# Altium footprint library Cyberdeck.PcbLib: 261 footprints (part 10 of 17)
Each footprint in its own frame and in the unit in brackets; x right, y up, seen from the top. Pads: shape width x height; smd on the part's side, far side on the other; paste and mask are expansions set on the pad; w line width, h text height; cw(c..) or ccw(c..) is an arc to the next point about the centre after c.
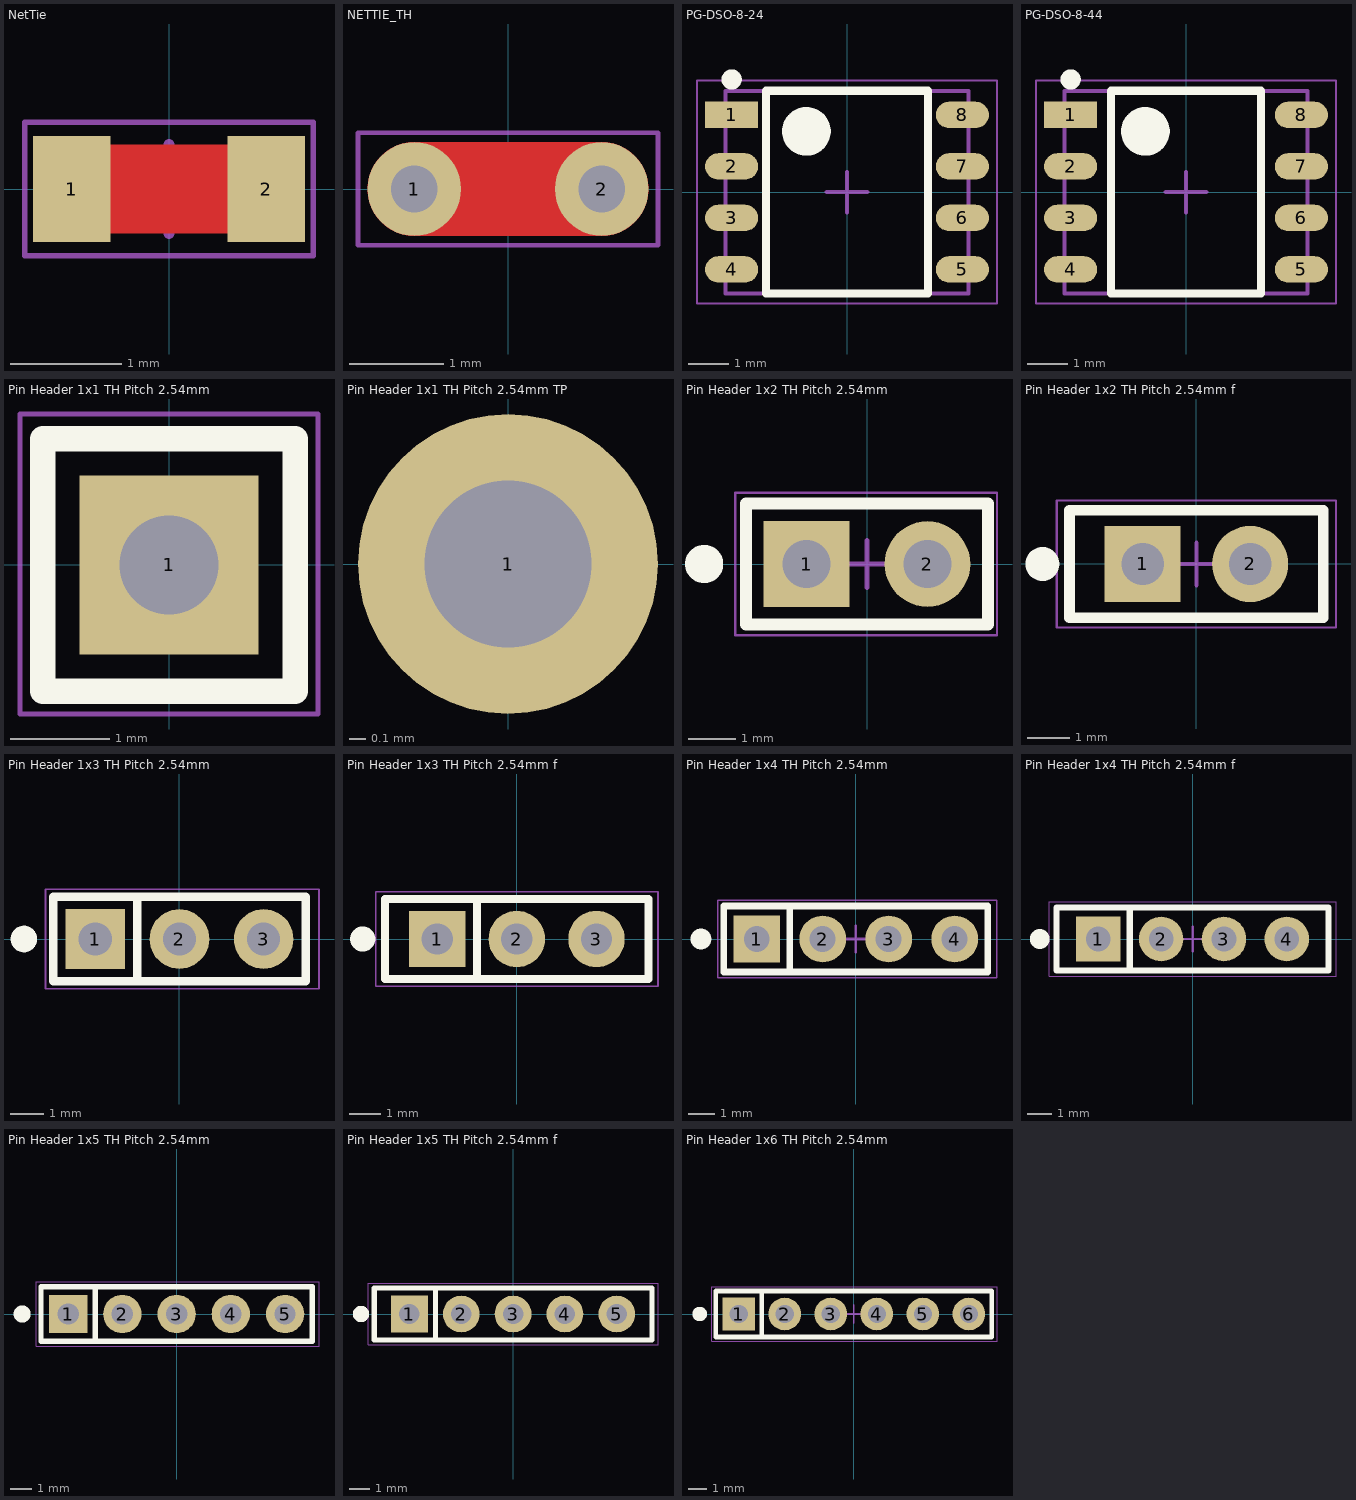
[diagram p9: the footprints below, top view; thin cyan lines are the x and y axes]

## NetTie [mm] "0603 fooprint"
pads (2):
  rect 0.7x0.95 smd paste-5 mask-5: 1(-0.875,0) 2(0.875,0)
Top Layer:
  rectangle: -1,-0.4 0.9,0.4
Courtyard Top:
  lines w0.05: -1.3,-0.6 1.3,-0.6 1.3,0.6 -1.3,0.6 -1.3,-0.6
  lines w0.1: -0.4,0 0.4,0 ; 0,-0.4 0,0.4

## NETTIE_TH [mm]
pads (2):
  round 1 hole 0.5: 1(-1,0) 2(1,0)
Top Layer:
  lines w1: -1,0 1,0
Courtyard Top:
  lines w0.05: -1.6,-0.6 -1.6,0.6 1.6,0.6 1.6,-0.6 -1.6,-0.6
  lines w0.1: -0.4,0 0.4,0 ; 0,-0.4 0,0.4

## PCB LEGEND [mm] "Layerlegend"
Top Layer:
  text "TOP / '.Pr_Firma' / '.Pr_PCB_Nr' Rev '.Pr_PCB_Revision' / '.Pr_Bezeichnung'" at 0,0 h1.52
Mid-Layer 1:
  text "MID 1 / '.Pr_Firma' / '.Pr_PCB_Nr' Rev '.Pr_PCB_Revision' / '.Pr_Bezeichnung'" at 0,0 h1.52
Mid-Layer 2:
  text "MID 2 / '.Pr_Firma' / '.Pr_PCB_Nr' Rev '.Pr_PCB_Revision' / '.Pr_Bezeichnung'" at 0,0 h1.52
Bottom Layer:
  text "BOT / '.Pr_Firma' / '.Pr_PCB_Nr' Rev '.Pr_PCB_Revision' / '.Pr_Bezeichnung'" at 28.5,0 h1.52
Mechanical 14:
  text "'.Pr_Firma' / '.Pr_Artikel_Nr'  / '.VariantName' / '.Pr_Bezeichnung'" at 0,0 h1.52

## PG-DSO-8-24 [mm] "PG-DSO-8-24"
height 1.75
pads (8):
  rect 1.31x0.65 smd: 1(-2.845,1.905)
  oval 1.31x0.65 smd: 2(-2.845,0.635) 3(-2.845,-0.635) 4(-2.845,-1.905) 5(2.845,-1.905) 6(2.845,-0.635) 7(2.845,0.635) 8(2.845,1.905)
Top Overlay:
  circle w0.6: c-1,1.5 r0.3
  circle w0.25: c-2.845,2.78 r0.125
  lines w0.2: -2,-2.5 2,-2.5 2,2.5 -2,2.5 -2,-2.5
Assembly Top:
  lines w0.1: -3,-2.5 3,-2.5 3,2.5 -3,2.5 -3,-2.5
Courtyard Top:
  lines w0.05: -3.7,-2.75 3.7,-2.75 3.7,2.75 -3.7,2.75 -3.7,-2.75
  lines w0.1: -0.5,0 0.5,0 ; 0,-0.5 0,0.5
3D body "PG-DSO-8-24.step": height 1.75, standoff 0, extent -3,-2.5 3,2.5

## PG-DSO-8-44 [mm] "infineon PG-DSO-8-44"
height 1.75
pads (8):
  rect 1.31x0.65 smd: 1(-2.845,1.905)
  oval 1.31x0.65 smd: 2(-2.845,0.635) 3(-2.845,-0.635) 4(-2.845,-1.905) 5(2.845,-1.905) 6(2.845,-0.635) 7(2.845,0.635) 8(2.845,1.905)
Top Overlay:
  circle w0.25: c-2.845,2.78 r0.125
  circle w0.6: c-1,1.5 r0.3
  lines w0.2: -1.85,-2.5 -1.85,2.5 1.85,2.5 1.85,-2.5 -1.85,-2.5
Assembly Top:
  lines w0.1: -3,-2.5 -3,2.5 3,2.5 3,-2.5 -3,-2.5
Courtyard Top:
  lines w0.05: -3.7,-2.75 -3.7,2.75 3.7,2.75 3.7,-2.75 -3.7,-2.75
  lines w0.1: -0.5,0 0.5,0 ; 0,-0.5 0,0.5
3D body "PG-DSO-8-44.step": height 1.75, standoff 0, extent -3,-2.5 3,2.5

## Pin Header 1x1 TH Pitch 2.54mm [mm] "PinHeader 1x1 TH Pitch 2.54mm"
height 9.5
pads (1):
  rect 1.8x1.8 hole 1: 1(0,0)
Top Overlay:
  lines w0.254: -1.27,1.27 1.27,1.27 ; -1.27,1.27 -1.27,-1.27 1.27,-1.27 1.27,1.27 ; -1.27,1.27 1.27,1.27
Assembly Top:
  lines w0.1: -1.27,-1.27 1.27,-1.27 1.27,1.27 -1.27,1.27 -1.27,-1.27
Courtyard Top:
  lines w0.05: -1.5,-1.5 -1.5,1.52 1.5,1.52 1.5,-1.5 -1.5,-1.5
  lines w0.1: -0.5,0 0.5,0 0,0 0,0.5 0,-0.5
3D body "DS1021-1x1SF11.stp": height 8.6, standoff -3, extent -1.27,-1.27 1.27,1.27

## Pin Header 1x1 TH Pitch 2.54mm TP [mm] "PinHeader 1x1 TH Pitch 2.54mm"
height 9.5
pads (1):
  round 1.8 hole 1: 1(0,0)
Courtyard Top:
  lines w0.1: -0.5,0 0.5,0 0,0 0,0.5 0,-0.5

## Pin Header 1x2 TH Pitch 2.54mm [mm] "PinHeader 1x2 TH Pitch 2.54mm"
height 9.5
pads (2):
  rect 1.8x1.8 hole 1: 1(-1.27,0)
  round 1.8 hole 1: 2(1.27,0)
Top Overlay:
  circle w0.5: c-3.42,0 r0.15
  lines w0.254: 0,1.27 -2.54,1.27 ; -2.54,1.27 2.54,1.27 2.54,-1.27 -2.54,-1.27 -2.54,1.27
Assembly Top:
  lines w0.1: -2.54,-1.27 -2.54,1.27 2.54,1.27 2.54,-1.27 -2.54,-1.27
Courtyard Top:
  lines w0.05: -2.77,-1.5 2.73,-1.5 2.73,1.5 -2.77,1.5 -2.77,-1.5
  lines w0.1: -0.5,0 0.5,0 ; 0,-0.5 0,0.5
3D body "DS1021-1x2SF11.stp": height 8.6, standoff -3, extent -2.54,-1.27 2.54,1.27

## Pin Header 1x2 TH Pitch 2.54mm f [mm] "PinHeader 1x2 TH Pitch 2.54mm female"
height 9.5
pads (2):
  rect 1.8x1.8 hole 1: 1(-1.27,0)
  round 1.8 hole 1: 2(1.27,0)
Top Overlay:
  circle w0.5: c-3.64,0 r0.15
  lines w0.254: -2.54,1.27 0,1.27 ; -3,-1.27 -3,1.27 3,1.27 3,-1.27 -3,-1.27
Assembly Top:
  lines w0.1: -2.94,-1.27 2.94,-1.27 2.94,1.27 -2.94,1.27 -2.94,-1.27
Courtyard Top:
  lines w0.05: -3.3,-1.5 -3.3,1.5 3.3,1.5 3.3,-1.5 -3.3,-1.5
  lines w0.1: -0.5,0 0.5,0 ; 0,-0.5 0,0.5
3D body "DS1023-1x2SF11.stp": height 8.5, standoff -3, extent -2.94,-1.27 2.94,1.27

## Pin Header 1x3 TH Pitch 2.54mm [mm] "PinHeader 1x3 TH Pitch 2.54mm"
height 9.5
pads (3):
  rect 1.8x1.8 hole 1: 1(-2.54,0)
  round 1.8 hole 1: 2(0,0) 3(2.54,0)
Top Overlay:
  circle w0.5: c-4.69,0 r0.15
  lines w0.254: -1.27,-1.27 -1.27,1.27 -3.81,1.27 ; -3.81,1.27 3.81,1.27 3.81,-1.27 -3.81,-1.27 -3.81,1.27
Assembly Top:
  lines w0.1: -3.81,-1.27 -3.81,1.27 3.81,1.27 3.81,-1.27 -3.81,-1.27
Courtyard Top:
  lines w0.05: -4.04,-1.5 -4.04,1.5 4.21,1.5 4.21,-1.5 -4.04,-1.5
  lines w0.1: -0.5,0 0.5,0 ; 0,-0.5 0,0.5
3D body "DS1021-1x3SF11.stp": height 8.6, standoff -3, extent -3.81,-1.27 3.81,1.27

## Pin Header 1x3 TH Pitch 2.54mm f [mm] "PinHeader 1x3 TH Pitch 2.54mm female"
height 9.5
pads (3):
  rect 1.8x1.8 hole 1: 1(-2.54,0)
  round 1.8 hole 1: 2(0,0) 3(2.54,0)
Top Overlay:
  circle w0.5: c-4.91,0 r0.15
  lines w0.254: -3.81,1.27 4.2,1.27 4.2,-1.27 -4.2,-1.27 -4.2,1.27 -1.27,1.27 -1.27,-1.27
Assembly Top:
  lines w0.1: -4.21,-1.27 4.21,-1.27 4.21,1.27 -4.21,1.27 -4.21,-1.27
Courtyard Top:
  lines w0.05: -4.5,-1.5 4.5,-1.5 4.5,1.5 -4.5,1.5 -4.5,-1.5
  lines w0.1: -0.5,0 0.5,0 ; 0,-0.5 0,0.5
3D body "DS1023-1x3SF11.stp": height 8.5, standoff -3, extent -4.21,-1.27 4.21,1.27

## Pin Header 1x4 TH Pitch 2.54mm [mm] "PinHeader 1x4 TH Pitch 2.54mm"
height 9.5
pads (4):
  rect 1.8x1.8 hole 1: 1(-3.81,0)
  round 1.8 hole 1: 2(-1.27,0) 3(1.27,0) 4(3.81,0)
Top Overlay:
  circle w0.5: c-5.96,0 r0.15
  lines w0.254: -2.54,-1.27 -2.54,1.27 -5.08,1.27 ; -5.08,1.27 5.08,1.27 5.08,-1.27 -5.08,-1.27 -5.08,1.27
Assembly Top:
  lines w0.1: -5.08,-1.27 5.08,-1.27 5.08,1.27 -5.08,1.27 -5.08,-1.27
Courtyard Top:
  lines w0.05: -5.31,-1.5 5.44,-1.5 5.44,1.5 -5.31,1.5 -5.31,-1.5
  lines w0.1: -0.5,0 0.5,0 ; 0,-0.5 0,0.5
3D body "DS1021-1x4SF11.stp": height 8.6, standoff -3, extent -5.08,-1.27 5.08,1.27

## Pin Header 1x4 TH Pitch 2.54mm f [mm] "PinHeader 1x4 TH Pitch 2.54mm female"
height 9.5
pads (4):
  rect 1.8x1.8 hole 1: 1(-3.81,0)
  round 1.8 hole 1: 2(-1.27,0) 3(1.27,0) 4(3.81,0)
Top Overlay:
  circle w0.5: c-6.18,0 r0.15
  lines w0.254: -5.08,1.27 5.5,1.27 5.5,-1.27 -5.5,-1.27 -5.5,1.27 -2.54,1.27 -2.54,-1.27
Assembly Top:
  lines w0.1: -5.48,-1.27 -5.48,1.27 5.48,1.27 5.48,-1.27 -5.48,-1.27
Courtyard Top:
  lines w0.05: -5.8,-1.5 -5.8,1.5 5.8,1.5 5.8,-1.5 -5.8,-1.5
  lines w0.1: -0.5,0 0.5,0 ; 0,-0.5 0,0.5
3D body "DS1023-1x4SF11.stp": height 8.5, standoff -3, extent -5.48,-1.27 5.48,1.27

## Pin Header 1x5 TH Pitch 2.54mm [mm] "PinHeader 1x5 TH Pitch 2.54mm"
height 9.5
pads (5):
  rect 1.8x1.8 hole 1: 1(-5.08,0)
  round 1.8 hole 1: 2(-2.54,0) 3(0,0) 4(2.54,0) 5(5.08,0)
Top Overlay:
  circle w0.5: c-7.23,0 r0.15
  lines w0.254: -3.81,-1.27 -3.81,1.27 -6.35,1.27 ; -6.35,1.27 6.35,1.27 6.35,-1.27 -6.35,-1.27 -6.35,1.27
Assembly Top:
  lines w0.1: -6.35,-1.27 -6.35,1.27 6.35,1.27 6.35,-1.27 -6.35,-1.27
Courtyard Top:
  lines w0.05: -6.58,-1.5 -6.58,1.5 6.67,1.5 6.67,-1.5 -6.58,-1.5
  lines w0.1: -0.5,0 0.5,0 ; 0,-0.5 0,0.5
3D body "DS1021-1x5SF11.stp": height 8.6, standoff -3, extent -6.35,-1.3 6.35,1.24

## Pin Header 1x5 TH Pitch 2.54mm f [mm] "PinHeader 1x5 TH Pitch 2.54mm female"
height 9.5
pads (5):
  rect 1.8x1.8 hole 1: 1(-5.08,0)
  round 1.8 hole 1: 2(-2.54,0) 3(0,0) 4(2.54,0) 5(5.08,0)
Top Overlay:
  circle w0.5: c-7.45,0 r0.15
  lines w0.254: -6.35,1.27 6.8,1.27 6.8,-1.27 -6.8,-1.27 -6.8,1.27 -3.81,1.27 -3.81,-1.27
Assembly Top:
  lines w0.1: -6.75,-1.27 -6.75,1.27 6.75,1.27 6.75,-1.27 -6.75,-1.27
Courtyard Top:
  lines w0.05: -7.1,-1.5 -7.1,1.5 7.1,1.5 7.1,-1.5 -7.1,-1.5
  lines w0.1: -0.5,0 0.5,0 ; 0,-0.5 0,0.5
3D body "DS1023-1x5SF11.stp": height 8.5, standoff -3, extent -6.75,-1.3 6.75,1.24

## Pin Header 1x6 TH Pitch 2.54mm [mm] "PinHeader 1x6 TH Pitch 2.54mm"
height 9.5
pads (6):
  rect 1.8x1.8 hole 1: 1(-6.35,0)
  round 1.8 hole 1: 2(-3.81,0) 3(-1.27,0) 4(1.27,0) 5(3.81,0) 6(6.35,0)
Top Overlay:
  circle w0.5: c-8.5,0 r0.15
  lines w0.254: -5.08,-1.27 -5.08,1.27 -7.62,1.27 ; -7.62,1.27 7.62,1.27 7.62,-1.27 -7.62,-1.27 -7.62,1.27
Assembly Top:
  lines w0.1: -7.62,-1.27 7.62,-1.27 7.62,1.27 -7.62,1.27 -7.62,-1.27
Courtyard Top:
  lines w0.05: -7.85,-1.5 -7.85,1.5 7.9,1.5 7.9,-1.5 -7.85,-1.5
  lines w0.1: -0.5,0 0.5,0 ; 0,-0.5 0,0.5
3D body "DS1021-1x6SF11.stp": height 8.6, standoff -3, extent -7.62,-1.27 7.62,1.27